# Altium footprint library QUTMS_RadioLibrary.PcbLib: 17 footprints (part 1 of 2)
Each footprint in its own frame and in the unit in brackets; x right, y up, seen from the top. Pads: shape width x height; smd on the part's side, far side on the other; paste and mask are expansions set on the pad; w line width, h text height; cw(c..) or ccw(c..) is an arc to the next point about the centre after c.
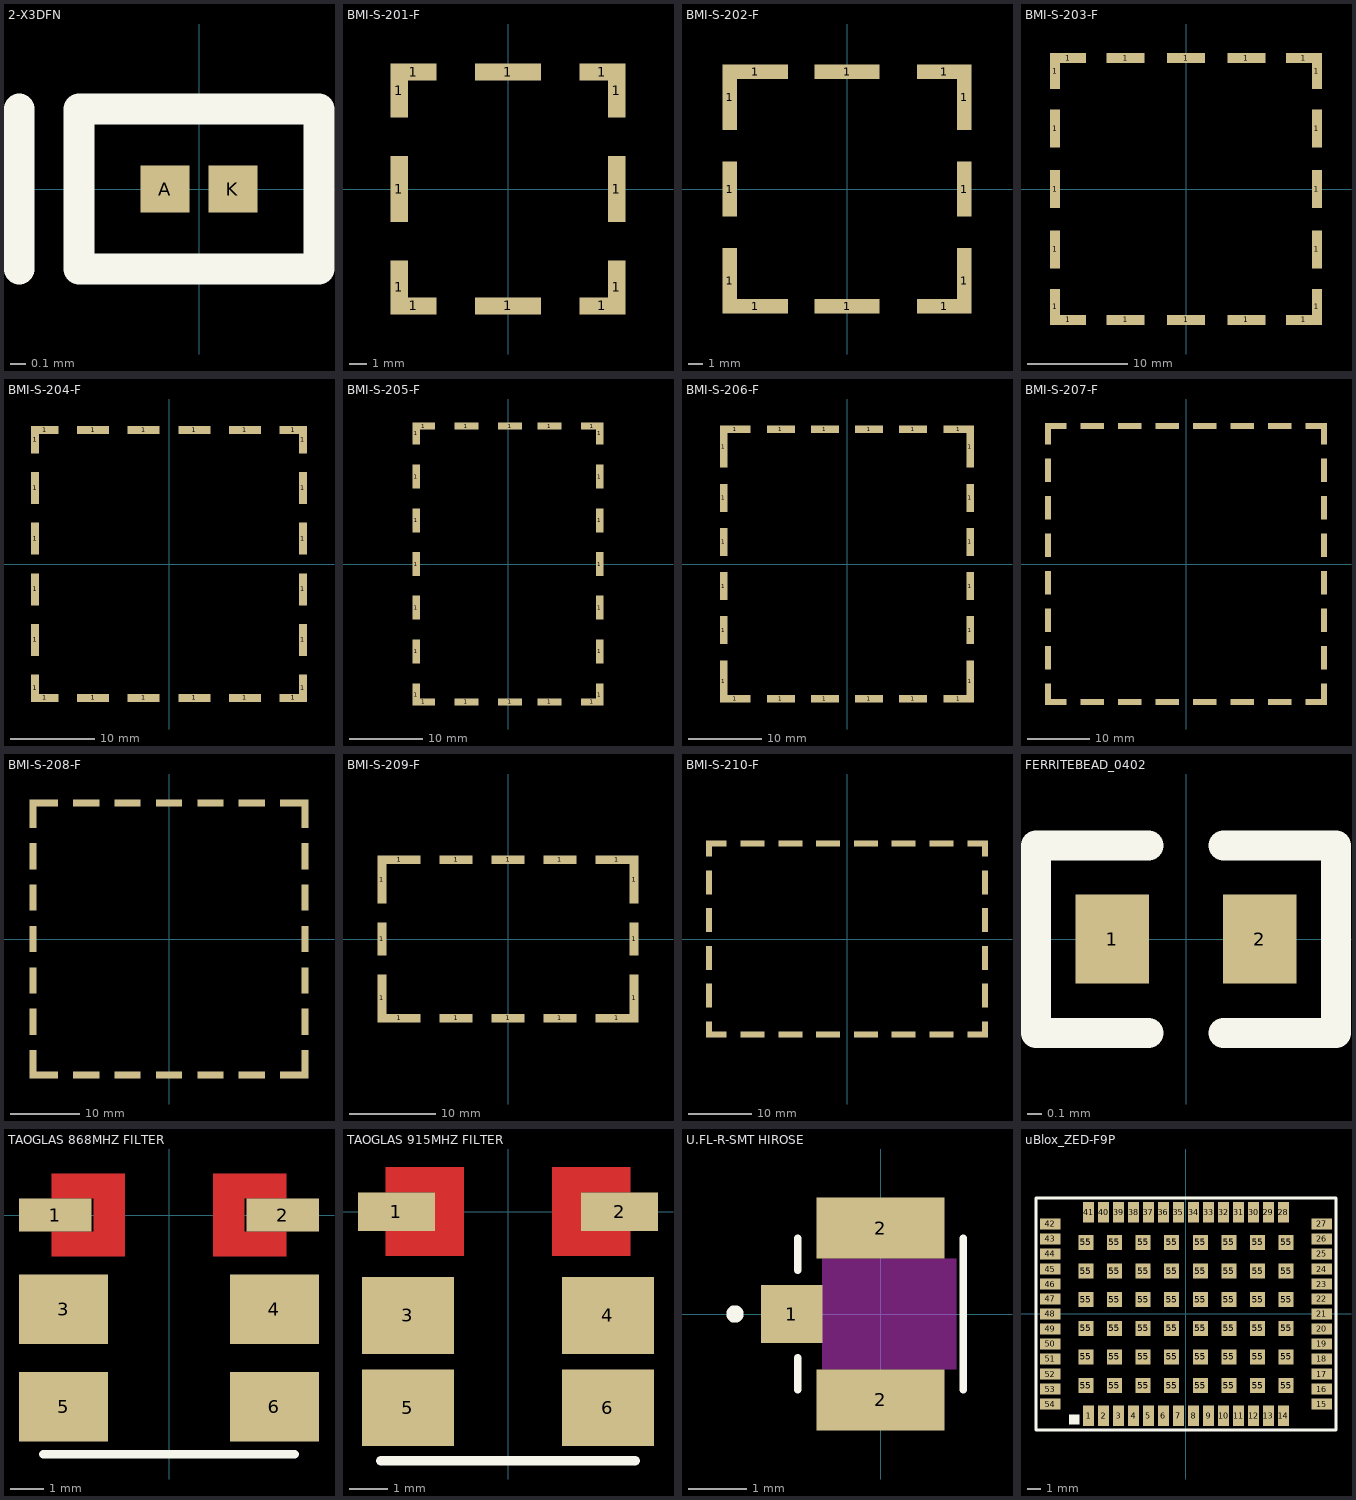
[diagram p0: the footprints below, top view; thin cyan lines are the x and y axes]

## 2-X3DFN [mm]
pads (2):
  rect 0.31x0.3 smd: A(-0.215,0) K(0.215,0)
Top Overlay:
  lines w0.2: -1.143,-0.508 -1.143,0.508 ; -0.762,-0.508 -0.762,0.508 0.762,0.508 0.762,-0.508 -0.762,-0.508
3D body: height 0.29, standoff 0.05, extent -0.31,-0.16 0.31,0.16

## BMI-S-201-F [mm]
pads (12):
  rect 1x3.13 smd: 1(-6.25,-5.665) 1(-6.25,5.665) 1(6.25,-5.665) 1(6.25,5.665)
  rect 1x3.8 smd: 1(-6.25,0) 1(6.25,0)
  rect 2.65x1 smd: 1(-5.425,-6.73) 1(-5.425,6.73) 1(5.425,-6.73) 1(5.425,6.73)
  rect 3.8x1 smd: 1(0,-6.73) 1(0,6.73)
3D body "Laird-BMI-S-201 Frame and Cover.STEP": height 12.57, standoff 0.03, extent -6.655,-7.135 6.655,7.135

## BMI-S-202-F [mm]
pads (12):
  rect 1x4.55 smd: 1(-8.15,-6.375) 1(-8.15,6.375) 1(8.15,-6.375) 1(8.15,6.375)
  rect 1x3.8 smd: 1(-8.15,0) 1(8.15,0)
  rect 4.55x1 smd: 1(-6.375,-8.15) 1(-6.375,8.15) 1(0,-8.15) 1(0,8.15)
  rect 3.8x1 smd: 1(6.75,-8.15) 1(6.75,8.15)
3D body "Laird-BMI-S-202 Frame and Cover.STEP": height 12.8, standoff 0, extent -8.555,-8.555 8.555,8.555

## BMI-S-203-F [mm]
pads (20):
  rect 1x3.57 smd: 1(-13.005,-11.72) 1(-13.005,11.72) 1(13.005,-11.72) 1(13.005,11.72)
  rect 1x3.8 smd: 1(-13.005,-6) 1(-13.005,0) 1(-13.005,6) 1(13.005,-6) 1(13.005,0) 1(13.005,6)
  rect 3.57x1 smd: 1(-11.72,-13.005) 1(-11.72,13.005) 1(11.72,-13.005) 1(11.72,13.005)
  rect 3.8x1 smd: 1(-6,-13.005) 1(-6,13.005) 1(0,-13.005) 1(0,13.005) 1(6,-13.005) 1(6,13.005)
3D body "Laird-BMI-S-203 Frame and Cover.STEP": height 18.6, standoff 0.06, extent -13.41,-13.41 13.41,13.41

## BMI-S-204-F [mm]
pads (24):
  rect 1x3.3 smd: 1(-15.9,-14.75) 1(-15.9,14.75) 1(15.9,-14.75) 1(15.9,14.75)
  rect 1x3.8 smd: 1(-15.9,-9) 1(-15.9,-3) 1(-15.9,3) 1(-15.9,9) 1(15.9,-9) 1(15.9,-3) 1(15.9,3) 1(15.9,9)
  rect 3.3x1 smd: 1(-14.75,-15.9) 1(-14.75,15.9) 1(14.75,-15.9) 1(14.75,15.9)
  rect 3.8x1 smd: 1(-9,-15.9) 1(-9,15.9) 1(-3,-15.9) 1(-3,15.9) 1(3,-15.9) 1(3,15.9) 1(9,-15.9) 1(9,15.9)
3D body "Laird-BMI-S-204 Frame and Cover.STEP": height 23.13, standoff 0, extent -16.305,-16.305 16.305,16.305

## BMI-S-205-F [mm]
pads (24):
  rect 1x3.05 smd: 1(-12.6,-17.925) 1(-12.6,17.925) 1(12.6,-17.925) 1(12.6,17.925)
  rect 1x3.3 smd: 1(-12.6,-12) 1(-12.6,-6) 1(-12.6,0) 1(-12.6,6) 1(-12.6,12) 1(12.6,-12) 1(12.6,-6) 1(12.6,0) 1(12.6,6) 1(12.6,12)
  rect 3.05x1 smd: 1(-11.575,-18.95) 1(-11.575,18.95) 1(11.575,-18.95) 1(11.575,18.95)
  rect 3.3x1 smd: 1(-5.7,-18.95) 1(-5.7,18.95) 1(0.3,-18.95) 1(0.3,18.95) 1(5.7,-18.95) 1(5.7,18.95)
3D body "Laird-BMI-S-205 Frame and Cover.STEP": height 27, standoff 0, extent -13.005,-19.355 13.005,19.355

## BMI-S-206-F [mm]
pads (24):
  rect 1x5.72 smd: 1(-16.74,-15.955) 1(-16.74,15.955) 1(16.74,-15.955) 1(16.74,15.955)
  rect 1x3.8 smd: 1(-16.74,-9) 1(-16.74,-3) 1(-16.74,3) 1(-16.74,9) 1(16.74,-9) 1(16.74,-3) 1(16.74,3) 1(16.74,9)
  rect 4.14x1 smd: 1(-15.17,-18.315) 1(-15.17,18.315) 1(15.17,-18.315) 1(15.17,18.315)
  rect 3.8x1 smd: 1(-9,-18.315) 1(-9,18.315) 1(-3,-18.315) 1(-3,18.315) 1(3,-18.315) 1(3,18.315) 1(9,-18.315) 1(9,18.315)
3D body "Laird-BMI-S-206 Frame and Cover.STEP": height 23.6, standoff 0.06, extent -17.145,-18.72 17.145,18.72

## BMI-S-207-F [mm]
pads (32):
  rect 1x3.47 smd: 1(-22.085,-20.85) 1(-22.085,20.85) 1(22.085,-20.85) 1(22.085,20.85)
  rect 1x3.8 smd: 1(-22.085,-15) 1(-22.085,-9) 1(-22.085,-3) 1(-22.085,3) 1(-22.085,9) 1(-22.085,15) 1(22.085,-15) 1(22.085,-9) 1(22.085,-3) 1(22.085,3) 1(22.085,9) 1(22.085,15)
  rect 3.47x1 smd: 1(-20.85,-22.085) 1(-20.85,22.085) 1(20.85,-22.085) 1(20.85,22.085)
  rect 3.8x1 smd: 1(-15,-22.085) 1(-15,22.085) 1(-9,-22.085) 1(-9,22.085) 1(-3,-22.085) 1(-3,22.085) 1(3,-22.085) 1(3,22.085) 1(9,-22.085) 1(9,22.085) 1(15,-22.085) 1(15,22.085)
3D body "Laird-BMI-S-207 Frame and Cover.STEP": height 26, standoff 24, extent -22.394,-22.394 22.436,22.436

## BMI-S-208-F [mm]
pads (28):
  rect 1x4.1 smd: 1(-19.7,-18.15) 1(-19.7,18.15) 1(19.7,-18.15) 1(19.7,18.15)
  rect 1x3.8 smd: 1(-19.7,-12) 1(-19.7,-6) 1(-19.7,0) 1(-19.7,6) 1(-19.7,12) 1(19.7,-12) 1(19.7,-6) 1(19.7,0) 1(19.7,6) 1(19.7,12)
  rect 4.1x1 smd: 1(-18.15,-19.7) 1(-18.15,19.7) 1(18.15,-19.7) 1(18.15,19.7)
  rect 3.8x1 smd: 1(-12,-19.7) 1(-12,19.7) 1(-6,-19.7) 1(-6,19.7) 1(0,-19.7) 1(0,19.7) 1(6,-19.7) 1(6,19.7) 1(12,-19.7) 1(12,19.7)
3D body "Laird-BMI-S-208 Frame and Cover.STEP": height 27, standoff 0, extent -20.1,-20.1 20.1,20.1

## BMI-S-209-F [mm]
pads (16):
  rect 1x5.55 smd: 1(-14.58,-6.875) 1(-14.58,6.875) 1(14.58,-6.875) 1(14.58,6.875)
  rect 1x3.8 smd: 1(-14.58,0) 1(14.58,0)
  rect 4.98x1 smd: 1(-12.59,-9.15) 1(-12.59,9.15) 1(12.59,-9.15) 1(12.59,9.15)
  rect 3.8x1 smd: 1(-6,-9.15) 1(-6,9.15) 1(0,-9.15) 1(0,9.15) 1(6,-9.15) 1(6,9.15)
3D body "Laird-BMI-S-209 Frame and Cover.STEP": height 22, standoff 0, extent -14.98,-9.55 14.98,9.55

## BMI-S-210-F [mm]
pads (28):
  rect 1x2.55 smd: 1(-21.9,-14.375) 1(-21.9,14.375) 1(21.9,-14.375) 1(21.9,14.375)
  rect 1x3.8 smd: 1(-21.9,-9) 1(-21.9,-3) 1(-21.9,3) 1(-21.9,9) 1(21.9,-9) 1(21.9,-3) 1(21.9,3) 1(21.9,9)
  rect 3.3x1 smd: 1(-20.75,-15.15) 1(-20.75,15.15) 1(20.75,-15.15) 1(20.75,15.15)
  rect 3.8x1 smd: 1(-15,-15.15) 1(-15,15.15) 1(-9,-15.15) 1(-9,15.15) 1(-3,-15.15) 1(-3,15.15) 1(3,-15.15) 1(3,15.15) 1(9,-15.15) 1(9,15.15) 1(15,-15.15) 1(15,15.15)
3D body "Laird-BMI-S-210 Frame and Cover.STEP": height 18, standoff 0, extent -22.3,-15.55 22.3,15.55

## FERRITEBEAD_0402 [mm]
pads (2):
  rect 0.5x0.6 smd: 1(-0.5,0) 2(0.5,0)
Top Overlay:
  lines w0.203: -0.254,-0.635 -1.016,-0.635 -1.016,0.635 -0.254,0.635 ; 0.254,-0.635 1.016,-0.635 1.016,0.635 0.254,0.635
3D body "ferrite_bead_0402.STEP": height 0.5, standoff 0, extent -0.5,-0.254 0.5,0.246

## TAOGLAS 868MHZ FILTER [mm]
pads (6):
  rect 2.2x1 smd paste-0.1: 1(-3.438,0) 2(3.438,0)
  rect 2.7x2.1 smd paste-0.25: 3(-3.188,-2.85) 4(3.188,-2.85) 5(-3.188,-5.8) 6(3.188,-5.8)
Top Layer:
  pour cut-out: 3.549,-0.508 3.549,-1.25 1.338,-1.25 1.338,1.25 3.549,1.25 3.549,0.508 2.279,0.508 2.279,-0.508
  pour cut-out: -3.549,0.508 -3.549,1.25 -1.338,1.25 -1.338,-1.25 -3.549,-1.25 -3.549,-0.508 -2.279,-0.508 -2.279,0.508
Top Overlay:
  lines w0.254: -3.81,-7.239 3.81,-7.239
3D body: height 3.7, standoff 3.6, extent -3.556,-6.35 3.556,2.413
3D body: height 3.65, standoff 0.05, extent -3.65,-6.523 3.65,2.477

## TAOGLAS 915MHZ FILTER [mm]
pads (6):
  rect 2x1 smd paste-0.1: 1(-2.9,0) 2(2.9,0)
  rect 2.4x2 smd paste-0.25: 3(-2.6,-2.7) 4(2.6,-2.7) 5(-2.6,-5.1) 6(2.6,-5.1)
Top Layer:
  pour cut-out: -3.175,0.508 -3.175,1.15 -1.15,1.15 -1.15,-1.15 -3.175,-1.15 -3.175,-0.508 -1.905,-0.508 -1.905,0.508
  pour cut-out: 3.175,-0.508 3.175,-1.15 1.15,-1.15 1.15,1.15 3.175,1.15 3.175,0.508 1.905,0.508 1.905,-0.508
Top Overlay:
  lines w0.254: -3.302,-6.477 3.302,-6.477
3D body: height 3, standoff 0.1, extent -3,-6.223 3,2.477
3D body: height 3.05, standoff 2.9, extent -2.921,-6.096 2.921,2.413

## U.FL-R-SMT HIROSE [mm]
pads (3):
  rect 1.05x1 smd: 1(-1.525,0)
  rect 2.2x1.05 smd: 2(0,-1.475) 2(0,1.475)
Top Overlay:
  circle w0.15: c-2.5,0 r0.075
  lines w0.127: -1.42,-1.3 -1.42,-0.75 ; -1.42,0.75 -1.42,1.3 ; 1.42,-1.3 1.42,1.3
Keep-Out Layer:
  region: 1.3,-0.95 -1,-0.95 -1,0.95 1.3,0.95
3D body "U.FL-R-SMT(10)--3DModel-STEP-56544.STEP": height 1.25, standoff 0, extent -1.55,-1.5 1.55,1.5

## uBlox_ZED-F9P [mm]
pads (102):
  rect 0.8x1.5 smd: 1(-7.15,-7.45) 2(-6.05,-7.45) 3(-4.95,-7.45) 4(-3.85,-7.45) 5(-2.75,-7.45) 6(-1.65,-7.45) 7(-0.55,-7.45) 8(0.55,-7.45) 9(1.65,-7.45) 10(2.75,-7.45) 11(3.85,-7.45) 12(4.95,-7.45) 13(6.05,-7.45) 14(7.15,-7.45) 28(7.15,7.45) 29(6.05,7.45) 30(4.95,7.45) 31(3.85,7.45) 32(2.75,7.45) 33(1.65,7.45) 34(0.55,7.45) 35(-0.55,7.45) 36(-1.65,7.45) 37(-2.75,7.45) 38(-3.85,7.45) 39(-4.95,7.45) 40(-6.05,7.45) 41(-7.15,7.45)
  rect 1.5x0.8 smd: 15(9.95,-6.6) 16(9.95,-5.5) 17(9.95,-4.4) 18(9.95,-3.3) 19(9.95,-2.2) 20(9.95,-1.1) 21(9.95,0) 22(9.95,1.1) 23(9.95,2.2) 24(9.95,3.3) 25(9.95,4.4) 26(9.95,5.5) 27(9.95,6.6) 42(-9.95,6.6) 43(-9.95,5.5) 44(-9.95,4.4) 45(-9.95,3.3) 46(-9.95,2.2) 47(-9.95,1.1) 48(-9.95,0) 49(-9.95,-1.1) 50(-9.95,-2.2) 51(-9.95,-3.3) 52(-9.95,-4.4) 53(-9.95,-5.5) 54(-9.95,-6.6)
  rect 1.1x1.1 smd: 55(-7.35,-5.25) 55(-7.35,-3.15) 55(-7.35,-1.05) 55(-7.35,1.05) 55(-7.35,3.15) 55(-7.35,5.25) 55(-5.25,-5.25) 55(-5.25,-3.15) 55(-5.25,-1.05) 55(-5.25,1.05) 55(-5.25,3.15) 55(-5.25,5.25) 55(-3.15,-5.25) 55(-3.15,-3.15) 55(-3.15,-1.05) 55(-3.15,1.05) 55(-3.15,3.15) 55(-3.15,5.25) 55(-1.05,-5.25) 55(-1.05,-3.15) 55(-1.05,-1.05) 55(-1.05,1.05) 55(-1.05,3.15) 55(-1.05,5.25) 55(1.05,-5.25) 55(1.05,-3.15) 55(1.05,-1.05) 55(1.05,1.05) 55(1.05,3.15) 55(1.05,5.25) 55(3.15,-5.25) 55(3.15,-3.15) 55(3.15,-1.05) 55(3.15,1.05) 55(3.15,3.15) 55(3.15,5.25) 55(5.25,-5.25) 55(5.25,-3.15) 55(5.25,-1.05) 55(5.25,1.05) 55(5.25,3.15) 55(5.25,5.25) 55(7.35,-5.25) 55(7.35,-3.15) 55(7.35,-1.05) 55(7.35,1.05) 55(7.35,3.15) 55(7.35,5.25)
Top Overlay:
  rectangle: -8.587,-8.119 -7.825,-7.357
  lines w0.2: -11,-8.5 -11,8.5 11,8.5 11,-8.5 -11,-8.5
3D body: height 2.3, standoff 0.08, extent -9.603,-7.039 9.447,6.994
3D body "u-blox ZED-F9P.stp": height 2.2, standoff -0.04, extent -11,-8.5 11,8.5